# Altium footprint library ICs.PcbLib: 179 footprints (part 7 of 12)
Each footprint in its own frame and in the unit in brackets; x right, y up, seen from the top. Pads: shape width x height; smd on the part's side, far side on the other; paste and mask are expansions set on the pad; w line width, h text height; cw(c..) or ccw(c..) is an arc to the next point about the centre after c.
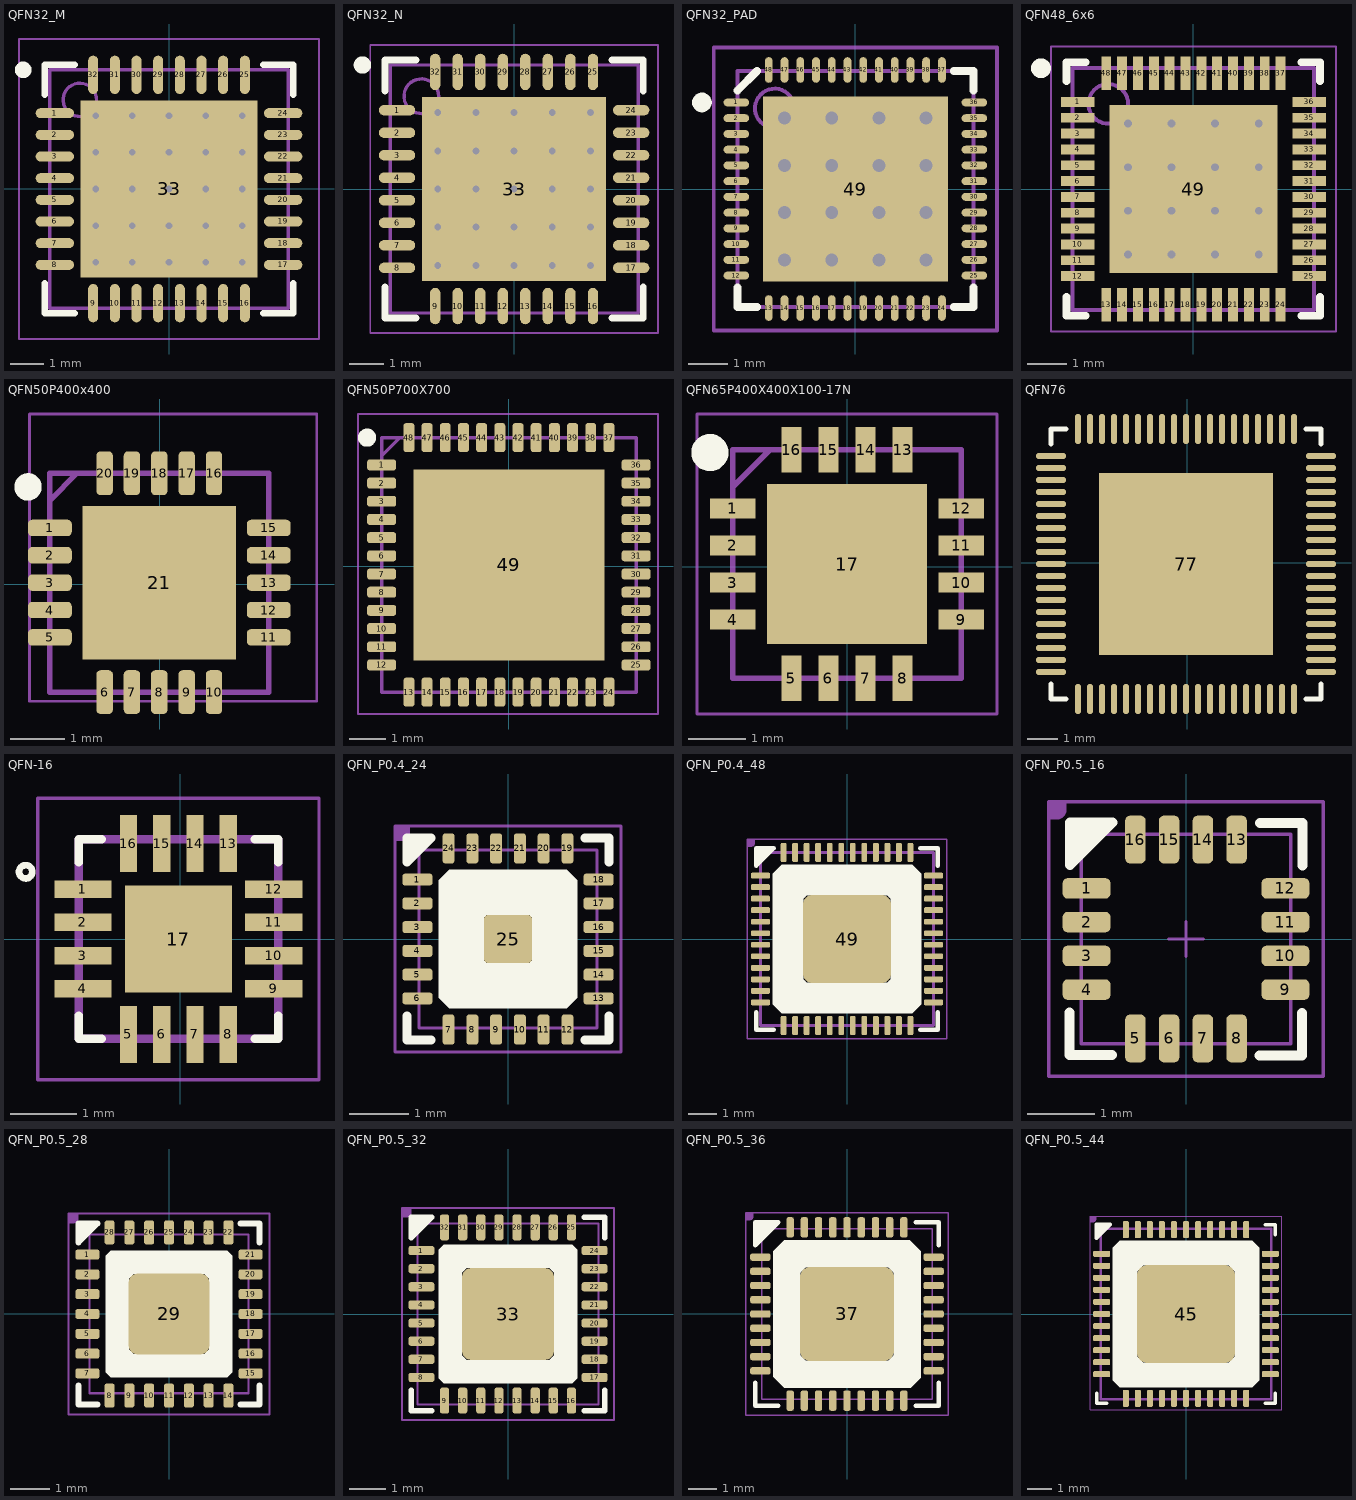
[diagram p6: the footprints below, top view; thin cyan lines are the x and y axes]

## QFN32_M [mm] "QFN, 32-Leads, Body 7x7mm, Pitch 0.65mm, Thermal Pad 5.3x5.3mm, IPC Low Density"
height 1
pads (33):
  oval 1.15x0.3 smd: 1(-3.425,2.275) 2(-3.425,1.625) 3(-3.425,0.975) 4(-3.425,0.325) 5(-3.425,-0.325) 6(-3.425,-0.975) 7(-3.425,-1.625) 8(-3.425,-2.275) 17(3.425,-2.275) 18(3.425,-1.625) 19(3.425,-0.975) 20(3.425,-0.325) 21(3.425,0.325) 22(3.425,0.975) 23(3.425,1.625) 24(3.425,2.275)
  oval 0.3x1.15 smd: 9(-2.275,-3.425) 10(-1.625,-3.425) 11(-0.975,-3.425) 12(-0.325,-3.425) 13(0.325,-3.425) 14(0.975,-3.425) 15(1.625,-3.425) 16(2.275,-3.425) 25(2.275,3.425) 26(1.625,3.425) 27(0.975,3.425) 28(0.325,3.425) 29(-0.325,3.425) 30(-0.975,3.425) 31(-1.625,3.425) 32(-2.275,3.425)
  rect 5.3x5.3 smd: 33(0,0)
via 2.2,-2.2 diameter 0.5 hole 0.2
via 1.1,-2.2 diameter 0.5 hole 0.2
via 0,-2.2 diameter 0.5 hole 0.2
via -1.1,-2.2 diameter 0.5 hole 0.2
via -2.2,-2.2 diameter 0.5 hole 0.2
via 2.2,-1.1 diameter 0.5 hole 0.2
via 1.1,-1.1 diameter 0.5 hole 0.2
via 0,-1.1 diameter 0.5 hole 0.2
via -1.1,-1.1 diameter 0.5 hole 0.2
via -2.2,-1.1 diameter 0.5 hole 0.2
via 2.2,0 diameter 0.5 hole 0.2
via 1.1,0 diameter 0.5 hole 0.2
via 0,0 diameter 0.5 hole 0.2
via -1.1,0 diameter 0.5 hole 0.2
via -2.2,0 diameter 0.5 hole 0.2
via 2.2,1.1 diameter 0.5 hole 0.2
via 1.1,1.1 diameter 0.5 hole 0.2
via 0,1.1 diameter 0.5 hole 0.2
via -1.1,1.1 diameter 0.5 hole 0.2
via -2.2,1.1 diameter 0.5 hole 0.2
via 2.2,2.2 diameter 0.5 hole 0.2
via 1.1,2.2 diameter 0.5 hole 0.2
via 0,2.2 diameter 0.5 hole 0.2
via -1.1,2.2 diameter 0.5 hole 0.2
via -2.2,2.2 diameter 0.5 hole 0.2
Top Overlay:
  circle w0.25: c-4.375,3.575 r0.125
  lines w0.2: -3.725,-2.825 -3.725,-3.725 -2.825,-3.725 ; -3.725,2.825 -3.725,3.725 -2.825,3.725 ; 2.825,-3.725 3.725,-3.725 3.725,-2.825 ; 2.825,3.725 3.725,3.725 3.725,2.825
Mechanical 13:
  circle w0.1: c-2.675,2.675 r0.5
  lines w0.1: -3.575,-3.575 3.575,-3.575 3.575,3.575 -3.575,3.575 -3.575,-3.575
Mechanical 15:
  lines w0.05: -4.5,-4.5 4.5,-4.5 4.5,4.5 -4.5,4.5 -4.5,-4.5
  lines w0.1: -0.5,0 0.5,0 ; 0,-0.5 0,0.5
3D body: height 1, standoff 0, extent -3.575,-3.575 3.575,3.575

## QFN32_N [mm] "QFN, 32-Leads, Body 7x7mm, Pitch 0.65mm, Thermal Pad 5.3x5.3mm, IPC Medium Density"
height 1
pads (33):
  oval 1.05x0.3 smd: 1(-3.375,2.275) 2(-3.375,1.625) 3(-3.375,0.975) 4(-3.375,0.325) 5(-3.375,-0.325) 6(-3.375,-0.975) 7(-3.375,-1.625) 8(-3.375,-2.275) 17(3.375,-2.275) 18(3.375,-1.625) 19(3.375,-0.975) 20(3.375,-0.325) 21(3.375,0.325) 22(3.375,0.975) 23(3.375,1.625) 24(3.375,2.275)
  oval 0.3x1.05 smd: 9(-2.275,-3.375) 10(-1.625,-3.375) 11(-0.975,-3.375) 12(-0.325,-3.375) 13(0.325,-3.375) 14(0.975,-3.375) 15(1.625,-3.375) 16(2.275,-3.375) 25(2.275,3.375) 26(1.625,3.375) 27(0.975,3.375) 28(0.325,3.375) 29(-0.325,3.375) 30(-0.975,3.375) 31(-1.625,3.375) 32(-2.275,3.375)
  rect 5.3x5.3 smd: 33(0,0)
via 2.2,-2.2 diameter 0.5 hole 0.2
via 1.1,-2.2 diameter 0.5 hole 0.2
via 0,-2.2 diameter 0.5 hole 0.2
via -1.1,-2.2 diameter 0.5 hole 0.2
via -2.2,-2.2 diameter 0.5 hole 0.2
via 2.2,-1.1 diameter 0.5 hole 0.2
via 1.1,-1.1 diameter 0.5 hole 0.2
via 0,-1.1 diameter 0.5 hole 0.2
via -1.1,-1.1 diameter 0.5 hole 0.2
via -2.2,-1.1 diameter 0.5 hole 0.2
via 2.2,0 diameter 0.5 hole 0.2
via 1.1,0 diameter 0.5 hole 0.2
via 0,0 diameter 0.5 hole 0.2
via -1.1,0 diameter 0.5 hole 0.2
via -2.2,0 diameter 0.5 hole 0.2
via 2.2,1.1 diameter 0.5 hole 0.2
via 1.1,1.1 diameter 0.5 hole 0.2
via 0,1.1 diameter 0.5 hole 0.2
via -1.1,1.1 diameter 0.5 hole 0.2
via -2.2,1.1 diameter 0.5 hole 0.2
via 2.2,2.2 diameter 0.5 hole 0.2
via 1.1,2.2 diameter 0.5 hole 0.2
via 0,2.2 diameter 0.5 hole 0.2
via -1.1,2.2 diameter 0.5 hole 0.2
via -2.2,2.2 diameter 0.5 hole 0.2
Top Overlay:
  circle w0.25: c-4.375,3.575 r0.125
  lines w0.2: -3.725,-2.825 -3.725,-3.725 -2.825,-3.725 ; -3.725,2.825 -3.725,3.725 -2.825,3.725 ; 2.825,-3.725 3.725,-3.725 3.725,-2.825 ; 2.825,3.725 3.725,3.725 3.725,2.825
Mechanical 13:
  circle w0.1: c-2.675,2.675 r0.5
  lines w0.1: -3.575,-3.575 3.575,-3.575 3.575,3.575 -3.575,3.575 -3.575,-3.575
Mechanical 15:
  lines w0.05: -4.15,-4.15 4.15,-4.15 4.15,4.15 -4.15,4.15 -4.15,-4.15
  lines w0.1: -0.5,0 0.5,0 ; 0,-0.5 0,0.5
3D body: height 1, standoff 0, extent -3.575,-3.575 3.575,3.575

## QFN32_PAD [mm]
pads (49):
  oval 0.65x0.2 smd: 1(-3.025,2.2) 2(-3.025,1.8) 3(-3.025,1.4) 4(-3.025,1) 5(-3.025,0.6) 6(-3.025,0.2) 7(-3.025,-0.2) 8(-3.025,-0.6) 9(-3.025,-1) 10(-3.025,-1.4) 11(-3.025,-1.8) 12(-3.025,-2.2) 25(3.025,-2.2) 26(3.025,-1.8) 27(3.025,-1.4) 28(3.025,-1) 29(3.025,-0.6) 30(3.025,-0.2) 31(3.025,0.2) 32(3.025,0.6) 33(3.025,1) 34(3.025,1.4) 35(3.025,1.8) 36(3.025,2.2)
  oval 0.2x0.65 smd: 13(-2.2,-3.025) 14(-1.8,-3.025) 15(-1.4,-3.025) 16(-1,-3.025) 17(-0.6,-3.025) 18(-0.2,-3.025) 19(0.2,-3.025) 20(0.6,-3.025) 21(1,-3.025) 22(1.4,-3.025) 23(1.8,-3.025) 24(2.2,-3.025) 37(2.2,3.025) 38(1.8,3.025) 39(1.4,3.025) 40(1,3.025) 41(0.6,3.025) 42(0.2,3.025) 43(-0.2,3.025) 44(-0.6,3.025) 45(-1,3.025) 46(-1.4,3.025) 47(-1.8,3.025) 48(-2.2,3.025)
  rect 4.7x4.7 smd: 49(0,0)
via 1.8,-1.8 diameter 0.66 hole 0.33
via 0.6,-1.8 diameter 0.66 hole 0.33
via -0.6,-1.8 diameter 0.66 hole 0.33
via -1.8,-1.8 diameter 0.66 hole 0.33
via 1.8,-0.6 diameter 0.66 hole 0.33
via 0.6,-0.6 diameter 0.66 hole 0.33
via -0.6,-0.6 diameter 0.66 hole 0.33
via -1.8,-0.6 diameter 0.66 hole 0.33
via 1.8,0.6 diameter 0.66 hole 0.33
via 0.6,0.6 diameter 0.66 hole 0.33
via -0.6,0.6 diameter 0.66 hole 0.33
via -1.8,0.6 diameter 0.66 hole 0.33
via 1.8,1.8 diameter 0.66 hole 0.33
via 0.6,1.8 diameter 0.66 hole 0.33
via -0.6,1.8 diameter 0.66 hole 0.33
via -1.8,1.8 diameter 0.66 hole 0.33
Top Overlay:
  circle w0.25: c-3.9,2.2 r0.125
  lines w0.2: -3,-2.5 -3,-3 -2.5,-3 ; -3,2.5 -2.5,3 ; 2.5,-3 3,-3 3,-2.5 ; 2.5,3 3,3 3,2.5
Mechanical 13:
  circle w0.1: c-2.05,2.05 r0.5
  lines w0.1: -3,-3 3,-3 3,3 -3,3 -3,-3
Mechanical 15:
  lines w0.1: -0.5,0 0.5,0 ; 0,-0.5 0,0.5 ; -3.6,-3.6 3.6,-3.6 3.6,3.6 -3.6,3.6 -3.6,-3.6
3D body "User Library-QFN48.step": height 0.86, standoff -0.01, extent -3.02,-3.02 3.02,3.02

## QFN48_6x6 [mm] "QFN, 48-Leads, Body 6.05x6.05mm, Pitch 0.40mm, Thermal Pad 4.25x4.25mm, IPC Medium Density"
height 0.8
pads (49):
  rect 0.85x0.25 smd: 1(-2.925,2.2) 2(-2.925,1.8) 3(-2.925,1.4) 4(-2.925,1) 5(-2.925,0.6) 6(-2.925,0.2) 7(-2.925,-0.2) 8(-2.925,-0.6) 9(-2.925,-1) 10(-2.925,-1.4) 11(-2.925,-1.8) 12(-2.925,-2.2) 25(2.925,-2.2) 26(2.925,-1.8) 27(2.925,-1.4) 28(2.925,-1) 29(2.925,-0.6) 30(2.925,-0.2) 31(2.925,0.2) 32(2.925,0.6) 33(2.925,1) 34(2.925,1.4) 35(2.925,1.8) 36(2.925,2.2)
  rect 0.25x0.85 smd: 13(-2.2,-2.925) 14(-1.8,-2.925) 15(-1.4,-2.925) 16(-1,-2.925) 17(-0.6,-2.925) 18(-0.2,-2.925) 19(0.2,-2.925) 20(0.6,-2.925) 21(1,-2.925) 22(1.4,-2.925) 23(1.8,-2.925) 24(2.2,-2.925) 37(2.2,2.925) 38(1.8,2.925) 39(1.4,2.925) 40(1,2.925) 41(0.6,2.925) 42(0.2,2.925) 43(-0.2,2.925) 44(-0.6,2.925) 45(-1,2.925) 46(-1.4,2.925) 47(-1.8,2.925) 48(-2.2,2.925)
  rect 4.25x4.25 smd: 49(0,0)
via -1.65,1.65 diameter 0.5 hole 0.2
via -0.55,1.65 diameter 0.5 hole 0.2
via 0.55,1.65 diameter 0.5 hole 0.2
via 1.65,1.65 diameter 0.5 hole 0.2
via -1.65,0.55 diameter 0.5 hole 0.2
via -0.55,0.55 diameter 0.5 hole 0.2
via 0.55,0.55 diameter 0.5 hole 0.2
via 1.65,0.55 diameter 0.5 hole 0.2
via -1.65,-0.55 diameter 0.5 hole 0.2
via -0.55,-0.55 diameter 0.5 hole 0.2
via 0.55,-0.55 diameter 0.5 hole 0.2
via 1.65,-0.55 diameter 0.5 hole 0.2
via -1.65,-1.65 diameter 0.5 hole 0.2
via -0.55,-1.65 diameter 0.5 hole 0.2
via 0.55,-1.65 diameter 0.5 hole 0.2
via 1.65,-1.65 diameter 0.5 hole 0.2
Top Overlay:
  circle w0.25: c-3.85,3.05 r0.125
  lines w0.2: -3.2,-2.725 -3.2,-3.2 -2.725,-3.2 ; -3.2,2.725 -3.2,3.2 -2.725,3.2 ; 2.725,-3.2 3.2,-3.2 3.2,-2.725 ; 2.725,3.2 3.2,3.2 3.2,2.725
Mechanical 13:
  circle w0.1: c-2.15,2.15 r0.5
  lines w0.1: -3.05,-3.05 -3.05,3.05 3.05,3.05 3.05,-3.05 -3.05,-3.05
Mechanical 15:
  lines w0.05: -3.6,-3.6 -3.6,3.6 3.6,3.6 3.6,-3.6 -3.6,-3.6
  lines w0.1: -0.5,0 0.5,0 ; 0,-0.5 0,0.5
3D body "QFN48_6x6.step": height 0.8, standoff 0, extent -3.06,-3.06 3.06,3.06

## QFN50P400x400 [mm]
pads (21):
  rrect50% 0.8x0.3 smd: 1(-2.011,1.025) 2(-2.011,0.525) 3(-2.011,0.025) 4(-2.011,-0.475) 5(-2.011,-0.975) 11(1.989,-0.975) 12(1.989,-0.475) 13(1.989,0.025) 14(1.989,0.525) 15(1.989,1.025)
  rrect50% 0.3x0.8 smd: 6(-1.011,-1.975) 7(-0.511,-1.975) 8(-0.011,-1.975) 9(0.489,-1.975) 10(0.989,-1.975) 16(0.989,2.025) 17(0.489,2.025) 18(-0.011,2.025) 19(-0.511,2.025) 20(-1.011,2.025)
  rrect0% 2.8x2.8 smd: 21(-0.011,0.025)
Top Overlay:
  circle w0.25: c-2.411,1.775 r0.125
Mechanical 15:
  lines w0.1: -2.011,1.525 -1.511,2.025 ; -2.011,-1.975 1.989,-1.975 1.989,2.025 -2.011,2.025 -2.011,-1.975
Mechanical 20:
  lines w0.05: -2.382,-2.142 2.868,-2.142 2.868,3.108 -2.382,3.108 -2.382,-2.142
3D body "MCP73871-2CCI_ML.stp": height 1, standoff 0, extent -2.057,-2.017 2.043,2.083

## QFN50P700X700 [mm]
pads (49):
  rrect50% 0.8x0.3 smd: 1(-3.5,2.781) 2(-3.5,2.281) 3(-3.5,1.781) 4(-3.5,1.281) 5(-3.5,0.781) 6(-3.5,0.281) 7(-3.5,-0.219) 8(-3.5,-0.719) 9(-3.5,-1.219) 10(-3.5,-1.719) 11(-3.5,-2.219) 12(-3.5,-2.719) 25(3.5,-2.719) 26(3.5,-2.219) 27(3.5,-1.719) 28(3.5,-1.219) 29(3.5,-0.719) 30(3.5,-0.219) 31(3.5,0.281) 32(3.5,0.781) 33(3.5,1.281) 34(3.5,1.781) 35(3.5,2.281) 36(3.5,2.781)
  rrect50% 0.3x0.8 smd: 13(-2.75,-3.469) 14(-2.25,-3.469) 15(-1.75,-3.469) 16(-1.25,-3.469) 17(-0.75,-3.469) 18(-0.25,-3.469) 19(0.25,-3.469) 20(0.75,-3.469) 21(1.25,-3.469) 22(1.75,-3.469) 23(2.25,-3.469) 24(2.75,-3.469) 37(2.75,3.531) 38(2.25,3.531) 39(1.75,3.531) 40(1.25,3.531) 41(0.75,3.531) 42(0.25,3.531) 43(-0.25,3.531) 44(-0.75,3.531) 45(-1.25,3.531) 46(-1.75,3.531) 47(-2.25,3.531) 48(-2.75,3.531)
  rrect0% 5.25x5.25 smd: 49(0,0.031)
Top Overlay:
  circle w0.25: c-3.9,3.531 r0.125
Mechanical 15:
  lines w0.1: -3.5,3.031 -3,3.531 ; -3.5,-3.469 3.5,-3.469 3.5,3.531 -3.5,3.531 -3.5,-3.469
Mechanical 20:
  lines w0.05: -4.15,-4.069 4.1,-4.069 4.1,4.181 -4.15,4.181 -4.15,-4.069
3D body "ATSAMD21G18A-MUT.stp": height 0.9, standoff 0, extent -3.552,-3.52 3.548,3.58

## QFN65P400X400X100-17N [mm]
pads (17):
  rect 0.8x0.35 smd: 1(-2,1.026) 2(-2,0.376) 3(-2,-0.274) 4(-2,-0.924) 9(2,-0.924) 10(2,-0.274) 11(2,0.376) 12(2,1.026)
  rect 0.35x0.8 smd: 5(-0.975,-1.949) 6(-0.325,-1.949) 7(0.325,-1.949) 8(0.975,-1.949) 13(0.975,2.051) 14(0.325,2.051) 15(-0.325,2.051) 16(-0.975,2.051)
  rrect0% 2.8x2.8 smd: 17(0,0.051)
Top Overlay:
  circle w0.325: c-2.401,2.001 r0.162
Mechanical 15:
  lines w0.1: -2,1.401 -1.35,2.051 ; -2,-1.949 -2,2.051 2,2.051 2,-1.949 -2,-1.949
Mechanical 20:
  lines w0.05: -2.625,-2.574 -2.625,2.676 2.625,2.676 2.625,-2.574 -2.625,-2.574
3D body "TPS61090RSAR.stp": height 1, standoff 0, extent -2.032,-1.992 2.068,2.108

## QFN76 [mm]
pads (77):
  oval 1x0.2 smd: 1(-4.535,3.558) 2(-4.535,3.158) 3(-4.535,2.758) 4(-4.535,2.358) 5(-4.535,1.958) 6(-4.535,1.558) 7(-4.535,1.158) 8(-4.535,0.758) 9(-4.535,0.358) 10(-4.535,-0.042) 11(-4.535,-0.442) 12(-4.535,-0.842) 13(-4.535,-1.242) 14(-4.535,-1.642) 15(-4.535,-2.042) 16(-4.535,-2.442) 17(-4.535,-2.842) 18(-4.535,-3.242) 19(-4.535,-3.642) 39(4.465,-3.642) 40(4.465,-3.242) 41(4.465,-2.842) 42(4.465,-2.442) 43(4.465,-2.042) 44(4.465,-1.642) 45(4.465,-1.242) 46(4.465,-0.842) 47(4.465,-0.442) 48(4.465,-0.042) 49(4.465,0.358) 50(4.465,0.758) 51(4.465,1.158) 52(4.465,1.558) 53(4.465,1.958) 54(4.465,2.358) 55(4.465,2.758) 56(4.465,3.158) 57(4.465,3.558)
  oval 0.2x1 smd: 20(-3.635,-4.542) 21(-3.235,-4.542) 22(-2.835,-4.542) 23(-2.435,-4.542) 24(-2.035,-4.542) 25(-1.635,-4.542) 26(-1.235,-4.542) 27(-0.835,-4.542) 28(-0.435,-4.542) 29(-0.035,-4.542) 30(0.365,-4.542) 31(0.765,-4.542) 32(1.165,-4.542) 33(1.565,-4.542) 34(1.965,-4.542) 35(2.365,-4.542) 36(2.765,-4.542) 37(3.165,-4.542) 38(3.565,-4.542) 58(3.565,4.458) 59(3.165,4.458) 60(2.765,4.458) 61(2.365,4.458) 62(1.965,4.458) 63(1.565,4.458) 64(1.165,4.458) 65(0.765,4.458) 66(0.365,4.458) 67(-0.035,4.458) 68(-0.435,4.458) 69(-0.835,4.458) 70(-1.235,4.458) 71(-1.635,4.458) 72(-2.035,4.458) 73(-2.435,4.458) 74(-2.835,4.458) 75(-3.235,4.458) 76(-3.635,4.458)
  rect 5.81x6.06 smd: 77(-0.035,-0.042)
Top Overlay:
  lines w0.15: -4.535,-4.042 -4.535,-4.542 -4.035,-4.542 ; -4.535,3.958 -4.535,4.458 -4.035,4.458 ; 3.965,-4.542 4.465,-4.542 4.465,-4.042 ; 3.965,4.458 4.465,4.458 4.465,3.958

## QFN-16 [mm]
pads (17):
  rect 0.86x0.26 smd: 1(-1.46,0.75) 2(-1.46,0.25) 3(-1.46,-0.25) 4(-1.46,-0.75) 9(1.41,-0.75) 10(1.41,-0.25) 11(1.41,0.25) 12(1.41,0.75)
  rect 0.26x0.86 smd: 5(-0.775,-1.435) 6(-0.275,-1.435) 7(0.225,-1.435) 8(0.725,-1.435) 13(0.725,1.435) 14(0.225,1.435) 15(-0.275,1.435) 16(-0.775,1.435)
  rect 1.61x1.61 smd: 17(-0.025,0)
Top Overlay:
  circle w0.1: c-2.32,1.01 r0.1
  lines w0.127: -1.525,-1.15 -1.525,-1.5 -1.175,-1.5 ; -1.525,1.15 -1.525,1.5 -1.175,1.5 ; 1.125,-1.5 1.475,-1.5 1.475,-1.15 ; 1.125,1.5 1.475,1.5 1.475,1.15
Top Paste:
  region: -0.434,0.403 0.378,0.403 0.378,-0.409 -0.434,-0.409
Mechanical 1:
  lines w0.05: -2.14,-2.115 2.09,-2.115 2.09,2.115 -2.14,2.115 -2.14,-2.115
  lines w0.127: -1.525,-1.5 1.475,-1.5 1.475,1.5 -1.525,1.5 -1.525,-1.5

## QFN_P0.4_24 [mil]
height 39.37
pads (25):
  rrect50% 20x8 smd: 1(-60,39.37) 2(-60,23.62) 3(-60,7.87) 4(-60,-7.87) 5(-60,-23.62) 6(-60,-39.37) 13(60,-39.37) 14(60,-23.62) 15(60,-7.87) 16(60,7.87) 17(60,23.62) 18(60,39.37)
  rrect50% 8x20 smd: 7(-39.37,-60) 8(-23.62,-60) 9(-7.87,-60) 10(7.87,-60) 11(23.62,-60) 12(39.37,-60) 19(39.37,60) 20(23.62,60) 21(7.87,60) 22(-7.87,60) 23(-23.62,60) 24(-39.37,60)
  rrect20% 32x32 smd: 25(0,0)
Top Overlay:
  region: -67,67 -51,67 -67,51
  region: -39,46 39,46 46,39 46,-39 39,-46 12,-46 12,-16 14,-16 16,-14 16,14 14,16 -14,16 -16,14 -16,-14 -14,-16 12,-16 12,-46 -39,-46 -46,-39 -46,39
  lines w6: -67,-51 -67,-67 -51,-67 ; 51,-67 67,-67 67,-51 ; 51,67 67,67 67,51 ; -67,51 -51,67 -67,67 -67,51
Top Solder:
  region: -70,39.37 -70,-39.37 -50,-39.37 -50,39.37
  rectangle: -39.37,50 39.37,70
  region: 50,39.37 50,-39.37 70,-39.37 70,39.37
  rectangle: -39.37,-70 39.37,-50
Mechanical 13:
  lines w2: -10,0 10,0 ; 0,-10 0,10 ; -59.05,-59.06 -59.05,59.06 59.06,59.06 59.06,-59.06 -59.05,-59.06
Mechanical 14:
  region: -75,75 -65,75 -65,70 -65,69.01 -65.76,67.17 -67.17,65.76 -69.01,65 -70,65 -75,65
  lines w2: -75,-75 75,-75 75,75 -75,75 -75,-75
  text ".Designator" at -41,-25 h100
3D body "QFN40P300X300X100-24L.step": height 39.37, standoff 0, extent -59.84,-59.84 59.85,59.85

## QFN_P0.4_48 [mil]
height 35.43
pads (49):
  rrect50% 26x8 smd: 1(-118,86.61) 2(-118,70.87) 3(-118,55.12) 4(-118,39.37) 5(-118,23.62) 6(-118,7.87) 7(-118,-7.87) 8(-118,-23.62) 9(-118,-39.37) 10(-118,-55.12) 11(-118,-70.87) 12(-118,-86.61) 25(118,-86.61) 26(118,-70.87) 27(118,-55.12) 28(118,-39.37) 29(118,-23.62) 30(118,-7.87) 31(118,7.87) 32(118,23.62) 33(118,39.37) 34(118,55.12) 35(118,70.87) 36(118,86.61)
  rrect50% 8x26 smd: 13(-86.61,-118) 14(-70.87,-118) 15(-55.12,-118) 16(-39.37,-118) 17(-23.62,-118) 18(-7.87,-118) 19(7.87,-118) 20(23.62,-118) 21(39.37,-118) 22(55.12,-118) 23(70.87,-118) 24(86.61,-118) 37(86.61,118) 38(70.87,118) 39(55.12,118) 40(39.37,118) 41(23.62,118) 42(7.87,118) 43(-7.87,118) 44(-23.62,118) 45(-39.37,118) 46(-55.12,118) 47(-70.87,118) 48(-86.61,118)
  rrect20% 120x120 smd: 49(0,0)
Top Overlay:
  region: -124.02,124.02 -100,124.02 -124.02,100
  region: -101,89 -89,101 -55,101 -55,60 -60,55 -60,-55 -55,-60 55,-60 60,-55 60,55 55,60 -55,60 -55,101 89,101 101,89 101,-89 89,-101 -89,-101 -101,-89
  lines w6: -124.02,-100 -124.02,-124.02 -100,-124.02 ; 100,-124.02 124.02,-124.02 124.02,-100 ; 100,124.02 124.02,124.02 124.02,100 ; -124.02,100 -124.02,124.02 -100,124.02 -124.02,100
Top Solder:
  rectangle: -86.61,-133 86.61,-103
  rectangle: -86.61,103 86.61,133
  region: 103,86.61 103,-86.61 133,-86.61 133,86.61
  region: -133,86.61 -133,-86.61 -103,-86.61 -103,86.61
Mechanical 13:
  lines w2: -10,0 10,0 ; 0,-10 0,10
  lines w3.94: -118.11,-118.11 -118.11,118.11 118.11,118.11 118.11,-118.11 -118.11,-118.11
Mechanical 14:
  region: -136,136 -126,136 -126,131 -126,130.01 -126.76,128.17 -128.17,126.76 -130.01,126 -131,126 -136,126
  lines w2: -136,-136 -136,136 136,136 136,-136 -136,-136
  text ".Designator" at -41,-25 h100
3D body "QFN40P600X600X90_HS-49N.step": height 35.43, standoff -0.04, extent -118.15,-118.15 118.15,118.15

## QFN_P0.5_16 [mil]
height 23.62
pads (16):
  rrect50% 28x12 smd: 1(-58,29.53) 2(-58,9.84) 3(-58,-9.84) 4(-58,-29.53) 9(58,-29.53) 10(58,-9.84) 11(58,9.84) 12(58,29.53)
  rrect50% 12x28 smd: 5(-29.53,-58) 6(-9.84,-58) 7(9.84,-58) 8(29.53,-58) 13(29.53,58) 14(9.84,58) 15(-9.84,58) 16(-29.53,58)
Top Overlay:
  region: -67.67,68 -43,68 -67.67,43.33
  lines w6: -68,-43 -68,-67.67 -43.33,-67.67 ; 43,-68 67.67,-68 67.67,-43.33 ; 43.33,67.67 68,67.67 68,43 ; -67.67,43.33 -43,68 -67.67,68 -67.67,43.33
Top Solder:
  region: 72,29.53 44,29.53 44,-29.53 72,-29.53
  region: -29.53,72 -29.53,44 29.53,44 29.53,72
  region: 29.53,-72 29.53,-44 -29.53,-44 -29.53,-72
  rectangle: -72,-29.53 -44,29.53
Mechanical 13:
  lines w2: -10,0 10,0 ; 0,-10 0,10 ; -61.02,-61.02 -61.02,61.02 61.02,61.02 61.02,-61.02 -61.02,-61.02
Mechanical 14:
  region: -80,80 -70,80 -70,75 -70,74.01 -70.76,72.17 -72.17,70.76 -74.01,70 -75,70 -80,70
  lines w2: -80,-80 80,-80 80,80 -80,80 -80,-80
  text ".Designator" at -41,-25 h100
3D body "QFN50P300X300X100-16N.step": height 39.37, standoff 0, extent -59.05,-59.05 59.06,59.06

## QFN_P0.5_28 [mil]
height 23.62
pads (29):
  rrect50% 24x10 smd: 1(-81,59.06) 2(-81,39.37) 3(-81,19.68) 4(-81,0) 5(-81,-19.68) 6(-81,-39.37) 7(-81,-59.06) 15(81,-59.06) 16(81,-39.37) 17(81,-19.68) 18(81,0) 19(81,19.68) 20(81,39.37) 21(81,59.06)
  rrect50% 10x24 smd: 8(-59.06,-81) 9(-39.37,-81) 10(-19.68,-81) 11(0,-81) 12(19.68,-81) 13(39.37,-81) 14(59.06,-81) 22(59.06,81) 23(39.37,81) 24(19.68,81) 25(0,81) 26(-19.68,81) 27(-39.37,81)
  rrect50% 9.84x24 smd: 28(-59.06,81)
  rrect20% 80x80 smd: 29(0,0)
Top Overlay:
  region: -90,90 -71,90 -90,71
  region: 63,57.99 63,-58 58,-63 -58,-63 -63,-58 -63,58 -58,63 57.99,63 60.5,60.5 37.5,37.5 35,40 -35,40 -40,35 -40,-35 -35,-40 35,-40 40,-35 40.01,35 37.5,37.5 60.5,60.5
  lines w6: -90,-71 -90,-90 -71,-90 ; 71,-90 90,-90 90,-71 ; 71,90 90,90 90,71 ; -90,71 -71,90 -90,90 -90,71
Top Solder:
  region: -68,93 -68,69 68,69 68,93
  region: 93,68 69,68 69,-68.06 93,-68.06
  region: 68,-93 68,-69 -68.05,-69 -68.05,-93
  rectangle: -93,-68 -69,68.06
Mechanical 13:
  lines w2: -10,0 10,0 ; 0,-10 0,10 ; -78.74,-78.74 78.74,-78.74 78.74,78.74 -78.74,78.74 -78.74,-78.74
Mechanical 14:
  region: -100,100 -90,100 -90,95 -90,94.01 -90.76,92.17 -92.17,90.76 -94.01,90 -95,90 -100,90
  lines w2: -100,-100 -100,100 100,100 100,-100 -100,-100
  text ".Designator" at -41,-25 h100
3D body "QFN50P400X400X55-28L.step": height 21.65, standoff 0, extent -78.78,-78.78 78.78,78.78

## QFN_P0.5_32 [mil]
height 39.37
pads (33):
  rrect50% 28x10 smd: 1(-94,68.9) 2(-94,49.21) 3(-94,29.53) 4(-94,9.84) 5(-94,-9.84) 6(-94,-29.53) 7(-94,-49.21) 8(-94,-68.9) 17(94,-68.9) 18(94,-49.21) 19(94,-29.53) 20(94,-9.84) 21(94,9.84) 22(94,29.53) 23(94,49.21) 24(94,68.9)
  rrect50% 10x28 smd: 9(-68.9,-94) 10(-49.21,-94) 11(-29.53,-94) 12(-9.84,-94) 13(9.84,-94) 14(29.53,-94) 15(49.21,-94) 16(68.9,-94) 25(68.9,94) 26(49.21,94) 27(29.53,94) 28(9.84,94) 29(-9.84,94) 30(-29.53,94) 31(-49.21,94) 32(-68.9,94)
  rrect20% 100x100 smd: 33(0,0)
Top Overlay:
  region: -83,105 -105,105 -105,83
  region: 75,70 75,-70 70,-75 -70,-75 -75,-70 -75,70 -70,75 70.01,75 73,72 48,47 45,50 -44.99,50.01 -50,45 -50,-45 -45,-50 45,-50 50,-45 50,45 48,47 73,72
  lines w6: -105,-83 -105,-105 -83,-105 ; 83,-105 105,-105 105,-83 ; 83,105 105,105 105,83 ; -105,83 -83,105 -105,105 -105,83
Top Solder:
  region: 108,68.9 80,68.9 80,-68.9 108,-68.9
  region: -80,68.9 -108,68.9 -108,-68.9 -80,-68.9
  region: 68.9,-108 68.9,-80 -68.9,-80 -68.9,-108
  region: 68.9,80 68.9,108 -68.9,108 -68.9,80
Mechanical 13:
  lines w2: -10,0 10,0 ; 0,-10 0,10 ; -98.42,-98.42 98.43,-98.42 98.43,98.43 -98.42,98.43 -98.42,-98.42
Mechanical 14:
  region: -115,115 -105,115 -105,110 -105,109.01 -105.76,107.17 -107.17,105.76 -109.01,105 -110,105 -115,105
  lines w2: -115,-115 115,-115 115,115 -115,115 -115,-115
  text ".Designator" at -41,-25 h100
3D body "QFN50P500X500X55-32L.step": height 21.65, standoff 0, extent -99.21,-99.21 99.22,99.22

## QFN_P0.5_36 [mil]
height 39.37
pads (37):
  rrect50% 28x10 smd: 1(-120,78.74) 2(-120,59.06) 3(-120,39.37) 4(-120,19.69) 5(-120,0) 6(-120,-19.68) 7(-120,-39.37) 8(-120,-59.05) 9(-120,-78.74) 19(120,-78.74) 20(120,-59.05) 21(120,-39.37) 22(120,-19.68) 23(120,0) 24(120,19.68) 25(120,39.37) 26(120,59.06) 27(120,78.74)
  rrect50% 10x28 smd: 10(-78.74,-120) 11(-59.06,-120) 12(-39.37,-120) 13(-19.69,-120) 14(0,-120) 15(19.68,-120) 16(39.37,-120) 17(59.05,-120) 18(78.74,-120) 28(78.74,120) 29(59.05,120) 30(39.37,120) 31(19.68,120) 32(0,120) 33(-19.69,120) 34(-39.37,120) 35(-59.06,120) 36(-78.74,120)
  rrect20% 130x130 smd: 37(0,0)
Top Overlay:
  region: -127,127 -95,127 -127,95
  region: 102,87.01 102,-88 88,-102 -86.99,-102 -102,-87 -102,87 -87,102 87.01,101.99 95,94 61.5,60.5 57,65 -57,65 -65,57 -65,-57 -56.99,-65 57,-65 65,-57 65.01,57 61.5,60.5 95,94
  lines w6: -127,-95 -127,-127 -95,-127 ; 95,-127 127,-127 127,-95 ; 95,127 127,127 127,95 ; -127,95 -95,127 -127,127 -127,95
Top Solder:
  rectangle: -134,-87.74 -106,87.74
  rectangle: 106,-87.74 134,87.74
  region: 87.74,-134 87.74,-106 -87.74,-106 -87.74,-134
  region: 87.74,106 87.74,134 -87.74,134 -87.74,106
Mechanical 13:
  lines w2: -10,0 10,0 ; 0,-10 0,10 ; -118.11,-118.11 -118.11,118.11 118.11,118.11 118.11,-118.11 -118.11,-118.11
Mechanical 14:
  region: -140,140 -130,140 -130,135 -130,134.01 -130.76,132.17 -132.17,130.76 -134.01,130 -135,130 -140,130
  lines w2: -140,-140 140,-140 140,140 -140,140 -140,-140
  text ".Designator" at -41,-25 h100
3D body "QFN50P600X600X90-36L.step": height 35.43, standoff 0, extent -118.89,-118.89 118.9,118.9

## QFN_P0.5_44 [mil]
height 39.37
pads (45):
  rrect50% 28x10 smd: 1(-138,98.43) 2(-138,78.74) 3(-138,59.06) 4(-138,39.37) 5(-138,19.68) 6(-138,0) 7(-138,-19.69) 8(-138,-39.37) 9(-138,-59.06) 10(-138,-78.74) 11(-138,-98.43) 23(138,-98.43) 24(138,-78.74) 25(138,-59.05) 26(138,-39.37) 27(138,-19.68) 28(138,0) 29(138,19.69) 30(138,39.37) 31(138,59.06) 32(138,78.74) 33(138,98.43)
  rrect50% 10x28 smd: 12(-98.43,-138) 13(-78.74,-138) 14(-59.06,-138) 15(-39.37,-138) 16(-19.69,-138) 17(0,-138) 18(19.68,-138) 19(39.37,-138) 20(59.06,-138) 21(78.74,-138) 22(98.43,-138) 34(98.43,138) 35(78.74,138) 36(59.06,138) 37(39.37,138) 38(19.68,138) 39(0,138) 40(-19.69,138) 41(-39.37,138) 42(-59.06,138) 43(-78.74,138) 44(-98.43,138)
  rrect20% 160x160 smd: 45(0,0)
Top Overlay:
  region: 120,108 120,-108 108,-120 -108,-120 -120,-108 -120,108 -108,120 108,120 114,114 75,75 70,80 -70,80 -80,70 -80,-70 -70,-80 70,-80 80,-70 80,70 75,75 114,114
  region: -124.34,146.34 -146.34,146.34 -146.34,124.34
  lines w6: -145.76,-129.76 -145.76,-145.76 -129.76,-145.76 ; 129.76,-145.76 145.76,-145.76 145.76,-129.76 ; 129.76,145.76 145.76,145.76 145.76,129.76 ; -146.34,124.34 -124.34,146.34 -146.34,146.34 -146.34,124.34
Top Solder:
  rectangle: -152,-107.43 -124,107.43
  rectangle: 124,-107.43 152,107.43
  region: 107.43,124 107.43,152 -107.43,152 -107.43,124
  region: 107.43,-152 107.43,-124 -107.43,-124 -107.43,-152
Mechanical 13:
  lines w2: -10,0 10,0 ; 0,-10 0,10
  lines w4: -139.76,-139.76 139.76,-139.76 139.76,139.76 -139.76,139.76 -139.76,-139.76
Mechanical 14:
  region: -157,160 -147,160 -147,155 -147,154.01 -147.76,152.17 -149.17,150.76 -151.01,150 -152,150 -157,150
  lines w2: -157,-157 -157,160 157,160 157,-157 -157,-157
  text ".Designator" at -41,-25 h100
3D body "User Library-smd_qfn-44-2.STEP": height 35.43, standoff 0, extent -137.82,-137.83 137.84,137.84